# Altium schematic symbol library NXP_60_26022015.SCHLIB: 1306 symbols (part 26 of 28)
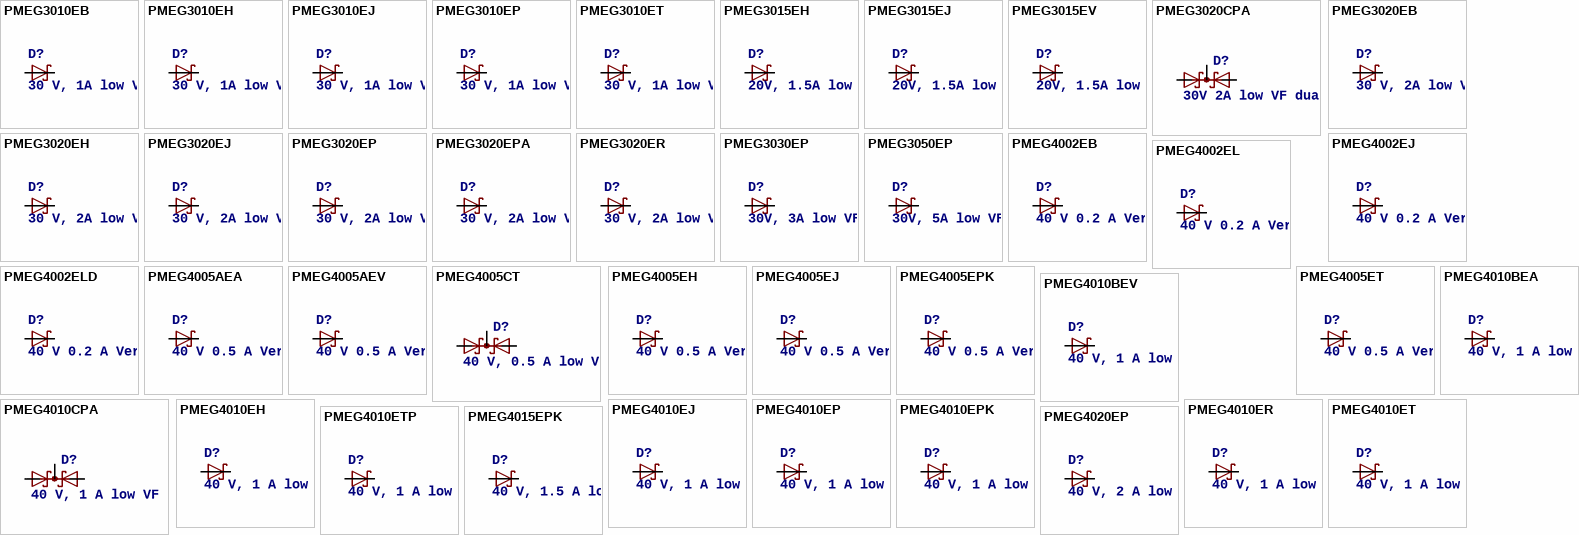
[diagram p210: symbols PMEG3010EB to PMEG4020EP]

## PMEG4010EPK
designator D?, comment 40 V, 1 A low VF MEGA Schottky barrier rectifier  Planar Maximum Efficiency General Application (MEGA) Schottky barrier rectifier with an integrated guard ring for stress protection.     AAL Eindhoven MK
footprint SOD1608
pins: 1 K, 2 A

## PMEG4010ER
designator D?, comment 40 V, 1 A low VF MEGA Schottky barrier rectifier  Planar Maximum Efficiency General Application (MEGA) Schottky barrier rectifier with an integrated guard ring for stress protection.     AAL Eindhoven MK
footprint SOD123W
pins: 1 K, 2 A

## PMEG4010ET
designator D?, comment 40 V, 1 A low VF MEGA Schottky barrier rectifier  Planar Maximum Efficiency General Application (MEGA) Schottky barrier rectifier with an integrated guard ring for stress protection.     AAL Eindhoven MK
footprint SOT23
pins: 1 A, 3 K

## PMEG4010ETP
designator D?, comment 40 V, 1 A low VF MEGA Schottky barrier rectifier  Planar Maximum Efficiency General Application (MEGA) Schottky barrier rectifier with an integrated guard ring for stress protection.     AAL Eindhoven MK
footprint SOD128
pins: 1 K, 2 A

## PMEG4015EPK
designator D?, comment 40 V, 1.5 A low VF MEGA Schottky barrier rectifier  Planar Maximum Efficiency General Application (MEGA) Schottky barrier rectifier with an integrated guard ring for stress protection, encapsulated in a leadless ultra small SOD1608 (DFN1608D-2) Surface-Mounted Device (SMD) plastic package with visible and solderable side pads     AAL Eindhoven MK
footprint SOD1608
pins: 1 K, 2 A

## PMEG4020EP
designator D?, comment 40 V, 2 A low VF MEGA Schottky barrier rectifier  Planar Maximum Efficiency General Application (MEGA) Schottky barrier rectifier with an integrated guard ring for stress protection.     AAL Eindhoven MK
footprint SOD128
pins: 1 K, 2 A

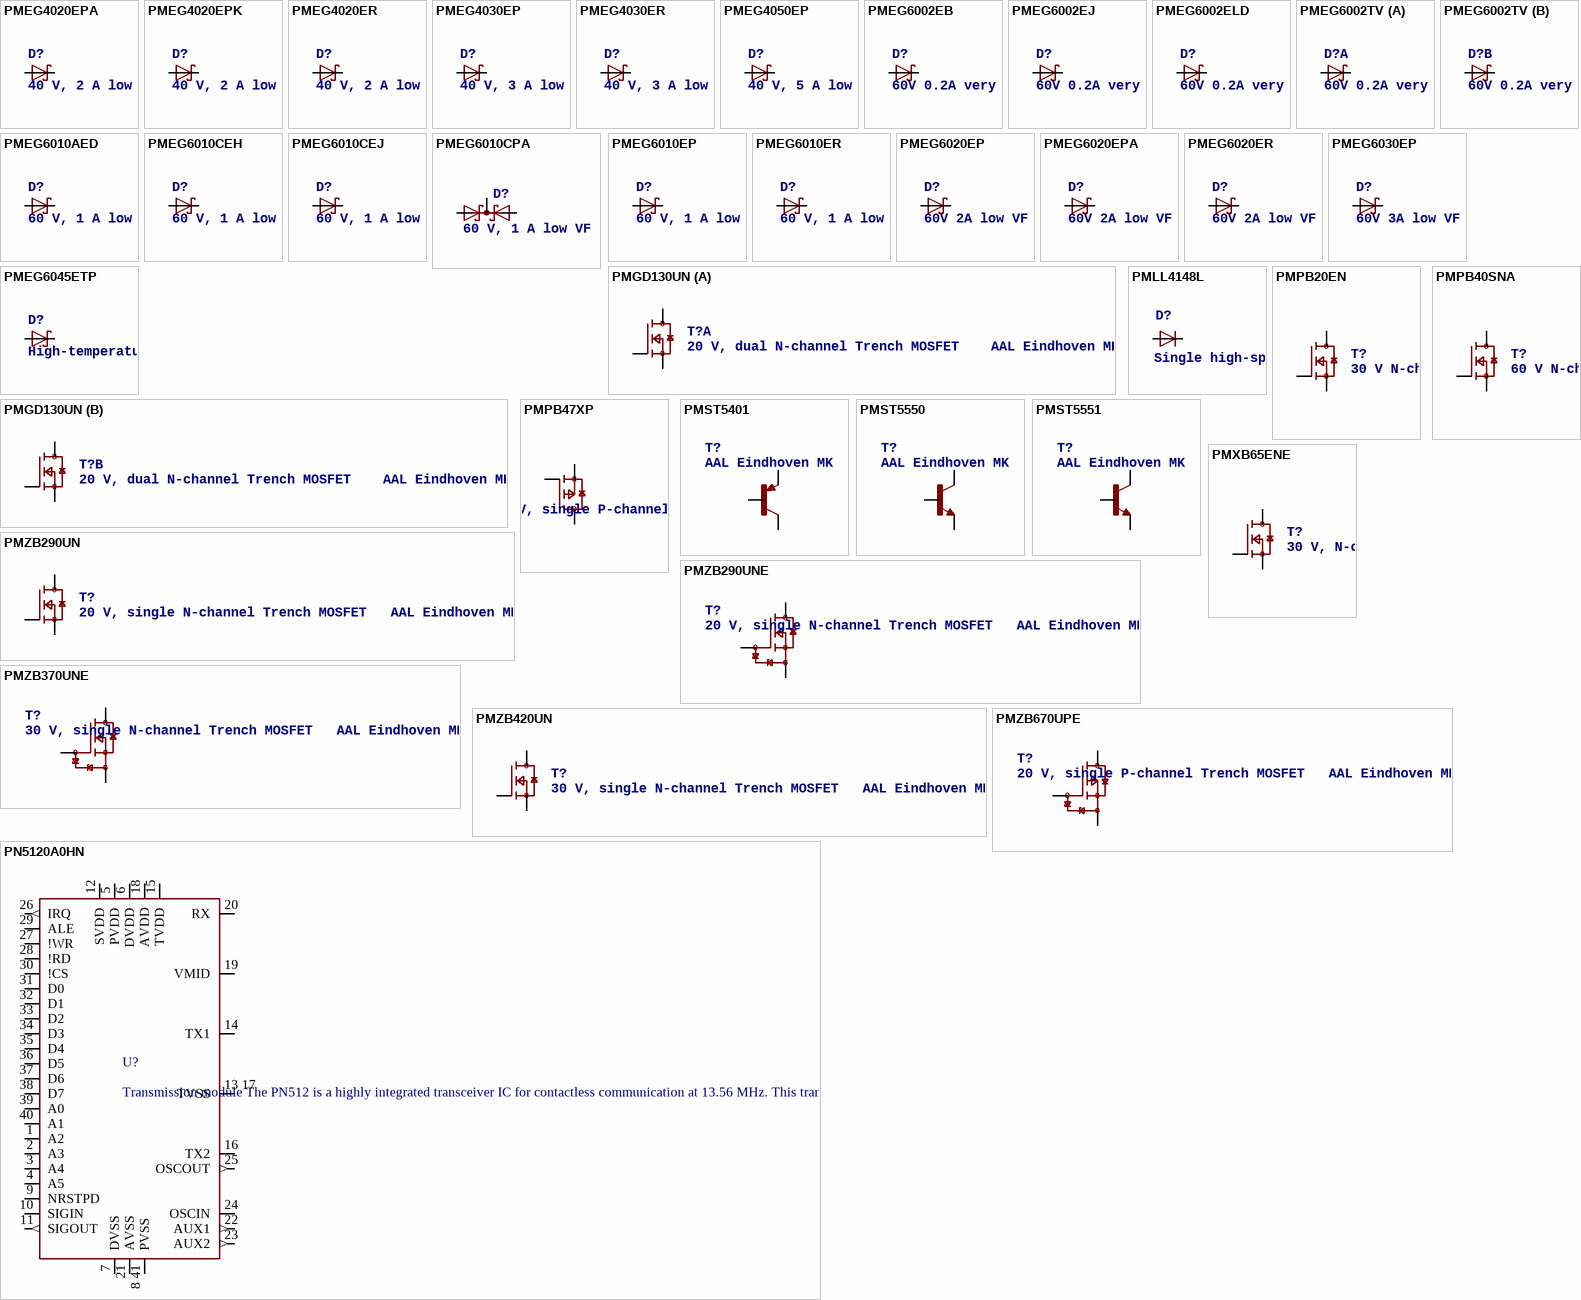
[diagram p171: symbols PMEG4020EPA to PN5120A0HN]

## PMEG4020EPA
designator D?, comment 40 V, 2 A low VF MEGA Schottky barrier rectifier  Planar Maximum Efficiency General Application (MEGA) Schottky barrier rectifier with an integrated guard ring for stress protection.     AAL Eindhoven MK
footprint SOT1061
pins: 1 2 A, 3 K

## PMEG4020EPK
designator D?, comment 40 V, 2 A low VF MEGA Schottky barrier rectifier  Planar Maximum Efficiency General Application (MEGA) Schottky barrier rectifier with an integrated guard ring for stress protection.     AAL Eindhoven MK
footprint SOD1608
pins: 1 K, 2 A

## PMEG4020ER
designator D?, comment 40 V, 2 A low VF MEGA Schottky barrier rectifier  Planar Maximum Efficiency General Application (MEGA) Schottky barrier rectifier with an integrated guard ring for stress protection.     AAL Eindhoven MK
footprint SOD123W
pins: 1 K, 2 A

## PMEG4030EP
designator D?, comment 40 V, 3 A low VF MEGA Schottky barrier rectifier  Planar Maximum Efficiency General Application (MEGA) Schottky barrier rectifier with an integrated guard ring for stress protection.     AAL Eindhoven MK
footprint SOD128
pins: 1 K, 2 A

## PMEG4030ER
designator D?, comment 40 V, 3 A low VF MEGA Schottky barrier rectifier  Planar Maximum Efficiency General Application (MEGA) Schottky barrier rectifier with an integrated guard ring for stress protection.     AAL Eindhoven MK
footprint SOD123W
pins: 1 K, 2 A

## PMEG4050EP
designator D?, comment 40 V, 5 A low VF MEGA Schottky barrier rectifier  Planar Maximum Efficiency General Application (MEGA) Schottky barrier rectifier with an integrated guard ring for stress protection.     AAL Eindhoven MK
footprint SOD128
pins: 1 K, 2 A

## PMEG6002EB
designator D?, comment 60V 0.2A very low VF MEGA Schottky barrier recti?ers Planar Maximum Ef?ciency General Application (MEGA) Schottky barrier recti?ers with an integrated guard ring for stress protection, encapsulated in ultra small and ?at lead Surface-Mounted Device (SMD) plastic packages.   AAL Eindhoven MK
footprint SOD523
pins: 1 K, 2 A

## PMEG6002EJ
designator D?, comment 60V 0.2A very low VF MEGA Schottky barrier recti?ers Planar Maximum Ef?ciency General Application (MEGA) Schottky barrier recti?ers with an integrated guard ring for stress protection, encapsulated in ultra small and ?at lead Surface-Mounted Device (SMD) plastic packages.   AAL Eindhoven MK
footprint SOD323(F)
pins: 1 K, 2 A

## PMEG6002ELD
designator D?, comment 60V 0.2A very low VF MEGA Schottky barrier recti?ers Planar Maximum Ef?ciency General Application (MEGA) Schottky barrier recti?ers with an integrated guard ring for stress protection, encapsulated in ultra small and ?at lead Surface-Mounted Device (SMD) plastic packages.   AAL Eindhoven MK
footprint SOD882D
pins: 1 K, 2 A

## PMEG6002TV
designator D?, comment 60V 0.2A very low VF MEGA Schottky barrier recti?ers Planar Maximum Ef?ciency General Application (MEGA) Schottky barrier recti?ers with an integrated guard ring for stress protection, encapsulated in ultra small and ?at lead Surface-Mounted Device (SMD) plastic packages.   AAL Eindhoven MK
footprint SOT666
part A pins: 1 A, 6 K
part B pins: 3 K, 4 A

## PMEG6010AED
designator D?, comment 60 V, 1 A low VF MEGA Schottky barrier rectifier  Planar Maximum Efficiency General Application (MEGA) Schottky barrier rectifier with an integrated guard ring for stress protection, encapsulated in a leadless ultra small SOD1608 (DFN1608D-2) Surface-Mounted Device (SMD) plastic package with visible and solderable side pads     AAL Eindhoven MK
footprint SOT457
pins: 1 2 5 6 K, 3 4 A

## PMEG6010CEH
designator D?, comment 60 V, 1 A low VF MEGA Schottky barrier rectifier  Planar Maximum Efficiency General Application (MEGA) Schottky barrier rectifier with an integrated guard ring for stress protection, encapsulated in a leadless ultra small SOD1608 (DFN1608D-2) Surface-Mounted Device (SMD) plastic package with visible and solderable side pads     AAL Eindhoven MK
footprint SOD123F
pins: 1 K, 2 A

## PMEG6010CEJ
designator D?, comment 60 V, 1 A low VF MEGA Schottky barrier rectifier  Planar Maximum Efficiency General Application (MEGA) Schottky barrier rectifier with an integrated guard ring for stress protection, encapsulated in a leadless ultra small SOD1608 (DFN1608D-2) Surface-Mounted Device (SMD) plastic package with visible and solderable side pads     AAL Eindhoven MK
footprint SOD323(F)
pins: 1 K, 2 A

## PMEG6010CPA
designator D?, comment 60 V, 1 A low VF MEGA Schottky barrier rectifier  Planar Maximum Efficiency General Application (MEGA) Schottky barrier rectifier with an integrated guard ring for stress protection, encapsulated in a leadless ultra small SOD1608 (DFN1608D-2) Surface-Mounted Device (SMD) plastic package with visible and solderable side pads     AAL Eindhoven MK
footprint SOT1061
pins: 1 A1, 2 A2, 3 K1K2

## PMEG6010EP
designator D?, comment 60 V, 1 A low VF MEGA Schottky barrier rectifier  Planar Maximum Efficiency General Application (MEGA) Schottky barrier rectifier with an integrated guard ring for stress protection, encapsulated in a leadless ultra small SOD1608 (DFN1608D-2) Surface-Mounted Device (SMD) plastic package with visible and solderable side pads     AAL Eindhoven MK
footprint SOD128
pins: 1 K, 2 A

## PMEG6010ER
designator D?, comment 60 V, 1 A low VF MEGA Schottky barrier rectifier  Planar Maximum Efficiency General Application (MEGA) Schottky barrier rectifier with an integrated guard ring for stress protection, encapsulated in a leadless ultra small SOD1608 (DFN1608D-2) Surface-Mounted Device (SMD) plastic package with visible and solderable side pads     AAL Eindhoven MK
footprint SOD123W
pins: 1 K, 2 A

## PMEG6020EP
designator D?, comment 60V 2A low VF dual MEGA Schottky barrier rectifier  Planar Maximum Efficiency General Application (MEGA) Schottky barrier rectifier in common cathode configuration with an integrated guard ring for stress protection, encapsulated in a SOT1061 leadless small Surface-Mounted Device (SMD) plastic package with medium power capability.    AAL Eindhoven MK
footprint SOD128
pins: 1 K, 2 A

## PMEG6020EPA
designator D?, comment 60V 2A low VF dual MEGA Schottky barrier rectifier  Planar Maximum Efficiency General Application (MEGA) Schottky barrier rectifier in common cathode configuration with an integrated guard ring for stress protection, encapsulated in a SOT1061 leadless small Surface-Mounted Device (SMD) plastic package with medium power capability.    AAL Eindhoven MK
footprint SOT1061
pins: 1 2 A, 3 K

## PMEG6020ER
designator D?, comment 60V 2A low VF dual MEGA Schottky barrier rectifier  Planar Maximum Efficiency General Application (MEGA) Schottky barrier rectifier in common cathode configuration with an integrated guard ring for stress protection, encapsulated in a SOT1061 leadless small Surface-Mounted Device (SMD) plastic package with medium power capability.    AAL Eindhoven MK
footprint SOD123W
pins: 1 K, 2 A

## PMEG6030EP
designator D?, comment 60V 3A low VF dual MEGA Schottky barrier rectifier  Planar Maximum Efficiency General Application (MEGA) Schottky barrier rectifier in common cathode configuration with an integrated guard ring for stress protection, encapsulated in a SOT1061 leadless small Surface-Mounted Device (SMD) plastic package with medium power capability.    AAL Eindhoven MK
footprint SOD128
pins: 1 K, 2 A

## PMEG6045ETP
designator D?, comment High-temperature 60 V, 4.5 A Schottky barrier rectifier Planar Maximum Efficiency General Application (MEGA) Schottky barrier rectifier with an integrated guard ring for stress protection, encapsulated in a SOD128 small and flat lead Surface-Mounted Device (SMD) plastic package.    AAL Eindhoven MK
footprint SOD128
pins: 1 K, 2 A

## PMGD130UN
designator T?, comment 20 V, dual N-channel Trench MOSFET    AAL Eindhoven MK
footprint SOT363
part A pins: 1 S, 2 G, 6 D
part B pins: 3 D, 4 S, 5 G

## PMLL4148L
designator D?, comment Single high-speed switching diodes, fabricated in planar technology, and encapsulated in small hermetically sealed glass SOD80C Surface-Mounted Device (SMD) packages.    AAL Eindhoven MK
FARNELL: 1097176
footprint SOD80C
pins: 1 K, 2 A

## PMPB20EN
designator T?, comment 30 V N-channel Trench MOSFET N-channel enhancement mode Field-Effect Transistor (FET) in a leadless medium power DFN2020MD-6 (SOT1220) Surface-Mounted Device (SMD) plastic package using Trench MOSFET technology.    AAL Eindhoven MK
footprint SOT1220
pins: 1 2 5 6 7 D, 3 G, 4 8 S

## PMPB40SNA
designator T?, comment 60 V N-channel Trench MOSFET N-channel enhancement mode Field-Effect Transistor (FET) in a leadless medium power DFN2020MD-6 (SOT1220) Surface-Mounted Device (SMD) plastic package using Trench MOSFET technology.    AAL Eindhoven MK
footprint SOT1220
pins: 1 2 5 6 7 D, 3 G, 4 8 S

## PMPB47XP
designator T?, comment 30 V, single P-channel Trench MOSFET P-channel enhancement mode Field-Effect Transistor (FET) in a leadless medium power DFN2020MD-6 (SOT1220) Surface-Mounted Device (SMD) plastic package using Trench MOSFET technology.    AAL Eindhoven MK
footprint SOT1220
pins: 1 2 5 6 7 D, 3 G, 4 8 S

## PMST5401
designator T?, comment AAL Eindhoven MK
footprint SOT323
pins: 1 B, 2 E, 3 C

## PMST5550
designator T?, comment AAL Eindhoven MK
footprint SOT323
pins: 1 B, 2 E, 3 C

## PMST5551
designator T?, comment AAL Eindhoven MK
footprint SOT323
pins: 1 B, 2 E, 3 C

## PMXB65ENE
designator T?, comment 30 V, N-channel Trench MOSFET N-channel enhancement mode Field-Effect Transistor (FET) in a leadless ultra small DFN1010D-3 (SOT1215) Surface-Mounted Device (SMD) plastic package using Trench MOSFET technology.    AAL Eindhoven MK
footprint SOT1215
pins: 1 G, 2 S, 3 D

## PMZB290UN
designator T?, comment 20 V, single N-channel Trench MOSFET   AAL Eindhoven MK
footprint SOT883(B)
pins: 1 G, 2 S, 3 D

## PMZB290UNE
designator T?, comment 20 V, single N-channel Trench MOSFET   AAL Eindhoven MK
footprint SOT883(B)
pins: 1 G, 2 S, 3 D

## PMZB370UNE
designator T?, comment 30 V, single N-channel Trench MOSFET   AAL Eindhoven MK
footprint SOT883(B)
pins: 1 G, 2 S, 3 D

## PMZB420UN
designator T?, comment 30 V, single N-channel Trench MOSFET   AAL Eindhoven MK
footprint SOT883(B)
pins: 1 G, 2 S, 3 D

## PMZB670UPE
designator T?, comment 20 V, single P-channel Trench MOSFET   AAL Eindhoven MK
footprint SOT883(B)
pins: 1 G, 2 S, 3 D

## PN5120A0HN
designator U?, comment Transmission module The PN512 is a highly integrated transceiver IC for contactless communication at 13.56 MHz. This transceiver IC utilizes an outstanding modulation and demodulation concept completely integrated for different kinds of contactless communication methods and protocols at 13.56 MHz.     AAL Eindhoven MK
footprint SOT618-1
pins: 1 A2, 2 A3, 3 A4, 4 A5, 5 PVDD (power), 6 DVDD (power), 7 DVSS (power), 8 41 PVSS (power), 9 NRSTPD, 10 SIGIN, 11 SIGOUT (out), 12 SVDD (power), 13 17 TVSS, 14 TX1, 15 TVDD (power), 16 TX2, 18 AVDD (power), 19 VMID, 20 RX, 21 AVSS (power), 22 AUX1 (out), 23 AUX2 (out), 24 OSCIN, 25 OSCOUT (out), 26 IRQ (out), 27 !WR, 28 !RD, 29 ALE, 30 !CS, 31 D0, 32 D1, 33 D2, 34 D3, 35 D4, 36 D5, 37 D6, 38 D7, 39 A0, 40 A1

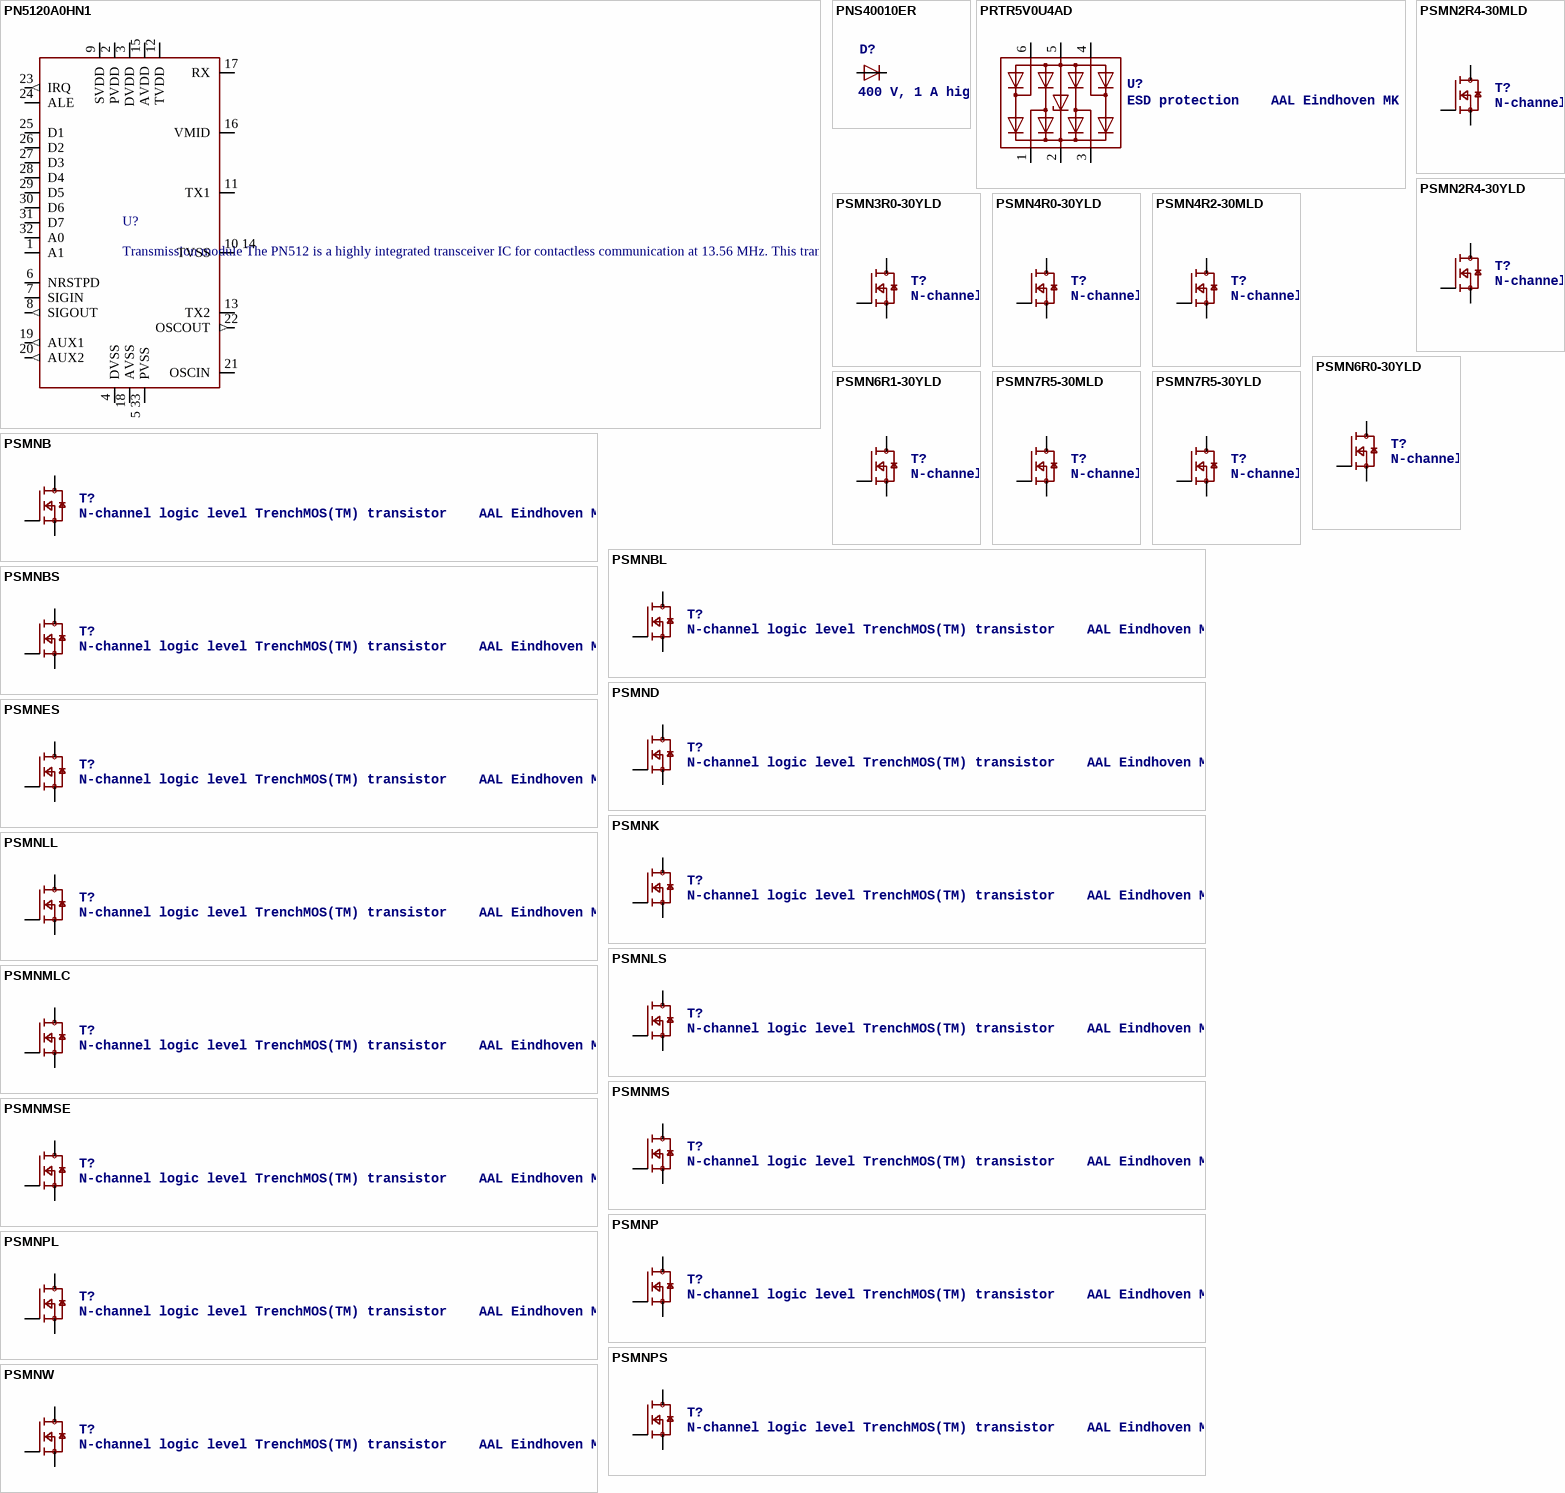
[diagram p172: symbols PN5120A0HN1 to PSMNW]

## PN5120A0HN1
designator U?, comment Transmission module The PN512 is a highly integrated transceiver IC for contactless communication at 13.56 MHz. This transceiver IC utilizes an outstanding modulation and demodulation concept completely integrated for different kinds of contactless communication methods and protocols at 13.56 MHz.     AAL Eindhoven MK
footprint SOT617-1
pins: 1 A1, 2 PVDD (power), 3 DVDD (power), 4 DVSS (power), 5 33 PVSS (power), 6 NRSTPD, 7 SIGIN, 8 SIGOUT (out), 9 SVDD (power), 10 14 TVSS, 11 TX1, 12 TVDD (power), 13 TX2, 15 AVDD (power), 16 VMID, 17 RX, 18 AVSS (power), 19 AUX1 (out), 20 AUX2 (out), 21 OSCIN, 22 OSCOUT (out), 23 IRQ (out), 24 ALE, 25 D1, 26 D2, 27 D3, 28 D4, 29 D5, 30 D6, 31 D7, 32 A0

## PNS40010ER
designator D?, comment 400 V, 1 A high power density, standard switching time PN-rectifier High power density, standard switching time PN-rectifier with high-efficiency planar technology, encapsulated in a small and flat lead SOD123W Surface-Mounted Device (SMD) plastic package.    AAL Eindhoven MK
footprint SOD123W
pins: 1 K, 2 A

## PRTR5V0U4AD
designator U?, comment ESD protection    AAL Eindhoven MK
FARNELL: 1757868
footprint SOT457
pins: 1 ESD1, 2 VCC (power), 3 ESD2, 4 ESD3, 5 GND (power), 6 ESD4

## PSMN2R4-30MLD
designator T?, comment N-channel 30 V, 2.4 mΩ logic level MOSFET in LFPAK33 using NextPowerS3 Technology Logic level gate drive N-channel enhancement mode MOSFET in LFPAK33 and LFPAK56 package. NextPowerS3 portfolio utilising NXP’s unique “SchottkyPlus” technology delivers high efficiency, low spiking performance usually associated with MOSFETs with an integrated Schottky or Schottky-like diode but without problematic high leakage current. NextPowerS3 is particularly suited to high efficiency applications at high switching frequencies.    AAL Eindhoven MK
footprint SOT1210
pins: 1 2 3 S, 4 G, MB@1 MB@2 MB@3 MB@4 D

## PSMN2R4-30YLD
designator T?, comment N-channel 30 V, 2.4 mΩ logic level MOSFET in LFPAK33 using NextPowerS3 Technology Logic level gate drive N-channel enhancement mode MOSFET in LFPAK33 and LFPAK56 package. NextPowerS3 portfolio utilising NXP’s unique “SchottkyPlus” technology delivers high efficiency, low spiking performance usually associated with MOSFETs with an integrated Schottky or Schottky-like diode but without problematic high leakage current. NextPowerS3 is particularly suited to high efficiency applications at high switching frequencies.    AAL Eindhoven MK
footprint SOT669
pins: 1 2 3 S, 4 G, MB D

## PSMN3R0-30YLD
designator T?, comment N-channel 30 V, 3.0 mΩ logic level MOSFET in LFPAK56 using NextPowerS3 Technology Logic level gate drive N-channel enhancement mode MOSFET in LFPAK56 package. NextPowerS3 portfolio utilising NXP’s unique “SchottkyPlus” technology delivers high efficiency, low spiking performance usually associated with MOSFETs with an integrated Schottky or Schottky-like diode but without problematic high leakage current. NextPowerS3 is particularly suited to high efficiency applications at high switching frequencies.    AAL Eindhoven MK
footprint SOT669
pins: 1 2 3 S, 4 G, MB D

## PSMN4R0-30YLD
designator T?, comment N-channel 30 V, 4.0 mΩ logic level MOSFET in LFPAK56 using NextPowerS3 Technology Logic level gate drive N-channel enhancement mode MOSFET in LFPAK56 package. NextPowerS3 portfolio utilising NXP’s unique “SchottkyPlus” technology delivers high efficiency, low spiking performance usually associated with MOSFETs with an integrated Schottky or Schottky-like diode but without problematic high leakage current. NextPowerS3 is particularly suited to high efficiency applications at high switching frequencies.    AAL Eindhoven MK
footprint SOT669
pins: 1 2 3 S, 4 G, MB D

## PSMN4R2-30MLD
designator T?, comment N-channel 30 V, 4.2 mΩ logic level MOSFET in LFPAK33 using NextPowerS3 Technology Logic level gate drive N-channel enhancement mode MOSFET in LFPAK33 package. NextPowerS3 portfolio utilising NXP’s unique “SchottkyPlus” technology delivers high efficiency, low spiking performance usually associated with MOSFETs with an integrated Schottky or Schottky-like diode but without problematic high leakage current. NextPowerS3 is particularly suited to high efficiency applications at high switching frequencies.    AAL Eindhoven MK
footprint SOT1210
pins: 1 2 3 S, 4 G, MB@1 MB@2 MB@3 MB@4 D

## PSMN6R0-30YLD
designator T?, comment N-channel 30 V, 6.0 mΩ logic level MOSFET in LFPAK56 using NextPowerS3 Technology Logic level gate drive N-channel enhancement mode MOSFET in LFPAK56 package. NextPowerS3 portfolio utilising NXP’s unique “SchottkyPlus” technology delivers high efficiency, low spiking performance usually associated with MOSFETs with an integrated Schottky or Schottky-like diode but without problematic high leakage current. NextPowerS3 is particularly suited to high efficiency applications at high switching frequencies.    AAL Eindhoven MK
footprint SOT669
pins: 1 2 3 S, 4 G, MB D

## PSMN6R1-30YLD
designator T?, comment N-channel 30 V, 6.1 mΩ logic level MOSFET in LFPAK56 using NextPowerS3 Technology Logic level gate drive N-channel enhancement mode MOSFET in LFPAK56 package. NextPowerS3 portfolio utilising NXP’s unique “SchottkyPlus” technology delivers high efficiency, low spiking performance usually associated with MOSFETs with an integrated Schottky or Schottky-like diode but without problematic high leakage current. NextPowerS3 is particularly suited to high efficiency applications at high switching frequencies.    AAL Eindhoven MK
footprint SOT669
pins: 1 2 3 S, 4 G, MB D

## PSMN7R5-30MLD
designator T?, comment N-channel 30 V, 7.5 mΩ logic level MOSFET in LFPAK33 using NextPowerS3 Technology Logic level gate drive N-channel enhancement mode MOSFET in LFPAK33 and LFPAK56 package. NextPowerS3 portfolio utilising NXP’s unique “SchottkyPlus” technology delivers high efficiency, low spiking performance usually associated with MOSFETs with an integrated Schottky or Schottky-like diode but without problematic high leakage current. NextPowerS3 is particularly suited to high efficiency applications at high switching frequencies.    AAL Eindhoven MK
footprint SOT1210
pins: 1 2 3 S, 4 G, MB@1 MB@2 MB@3 MB@4 D

## PSMN7R5-30YLD
designator T?, comment N-channel 30 V, 7.5 mΩ logic level MOSFET in LFPAK33 using NextPowerS3 Technology Logic level gate drive N-channel enhancement mode MOSFET in LFPAK33 and LFPAK56 package. NextPowerS3 portfolio utilising NXP’s unique “SchottkyPlus” technology delivers high efficiency, low spiking performance usually associated with MOSFETs with an integrated Schottky or Schottky-like diode but without problematic high leakage current. NextPowerS3 is particularly suited to high efficiency applications at high switching frequencies.    AAL Eindhoven MK
footprint SOT669
pins: 1 2 3 S, 4 G, MB D

## PSMNB
designator T?, comment N-channel logic level TrenchMOS(TM) transistor    AAL Eindhoven MK
footprint SOT404
pins: 1 G, 3 S, MB D

## PSMNBL
designator T?, comment N-channel logic level TrenchMOS(TM) transistor    AAL Eindhoven MK
footprint SOT404
pins: 1 G, 3 S, MB D

## PSMNBS
designator T?, comment N-channel logic level TrenchMOS(TM) transistor    AAL Eindhoven MK
footprint SOT404
pins: 1 G, 3 S, MB D

## PSMND
designator T?, comment N-channel logic level TrenchMOS(TM) transistor    AAL Eindhoven MK
footprint SOT428
pins: 1 G, 3 S, MB D

## PSMNES
designator T?, comment N-channel logic level TrenchMOS(TM) transistor    AAL Eindhoven MK
footprint SOT226
pins: 1 G, 2 D, 3 S

## PSMNK
designator T?, comment N-channel logic level TrenchMOS(TM) transistor    AAL Eindhoven MK
footprint SOT96-1
pins: 1 2 3 S, 4 G, 5 6 7 8 D

## PSMNLL
designator T?, comment N-channel logic level TrenchMOS(TM) transistor    AAL Eindhoven MK
footprint SOT873-1
pins: 1 2 3 S, 4 G, 5 6 7 8 D

## PSMNLS
designator T?, comment N-channel logic level TrenchMOS(TM) transistor    AAL Eindhoven MK
footprint SOT873-1
pins: 1 2 3 S, 4 G, 5 6 7 8 D

## PSMNMLC
designator T?, comment N-channel logic level TrenchMOS(TM) transistor    AAL Eindhoven MK
LOGIC_LEVEL: 13 mOhm; VOLTAGE: 30V; LOGIC_LEVEL: 2.8 mOhm; VOLTAGE: 25V; LOGIC_LEVEL: 2.9 mOhm; LOGIC_LEVEL: 3.0 mOhm; LOGIC_LEVEL: 3.9 mOhm; LOGIC_LEVEL: 4.4 mOhm; LOGIC_LEVEL: 7.0 mOhm; LOGIC_LEVEL: 9.0 mOhm; LOGIC_LEVEL: 9.8 mOhm
footprint SOT1210
pins: 1 2 3 S, 4 G, MB@1 MB@2 MB@3 MB@4 D

## PSMNMS
designator T?, comment N-channel logic level TrenchMOS(TM) transistor    AAL Eindhoven MK
footprint SOT1210
pins: 1 2 3 S, 4 G, MB@1 MB@2 MB@3 MB@4 D

## PSMNMSE
designator T?, comment N-channel logic level TrenchMOS(TM) transistor    AAL Eindhoven MK
footprint SOT1210
pins: 1 2 3 S, 4 G, MB@1 MB@2 MB@3 MB@4 D

## PSMNP
designator T?, comment N-channel logic level TrenchMOS(TM) transistor    AAL Eindhoven MK
footprint SOT78
pins: 1 G, 2 D, 3 S

## PSMNPL
designator T?, comment N-channel logic level TrenchMOS(TM) transistor    AAL Eindhoven MK
footprint SOT78
pins: 1 G, 2 D, 3 S

## PSMNPS
designator T?, comment N-channel logic level TrenchMOS(TM) transistor    AAL Eindhoven MK
footprint SOT78
pins: 1 G, 2 D, 3 S

## PSMNW
designator T?, comment N-channel logic level TrenchMOS(TM) transistor    AAL Eindhoven MK
footprint SOT429
pins: 1 G, 2 D, 3 S

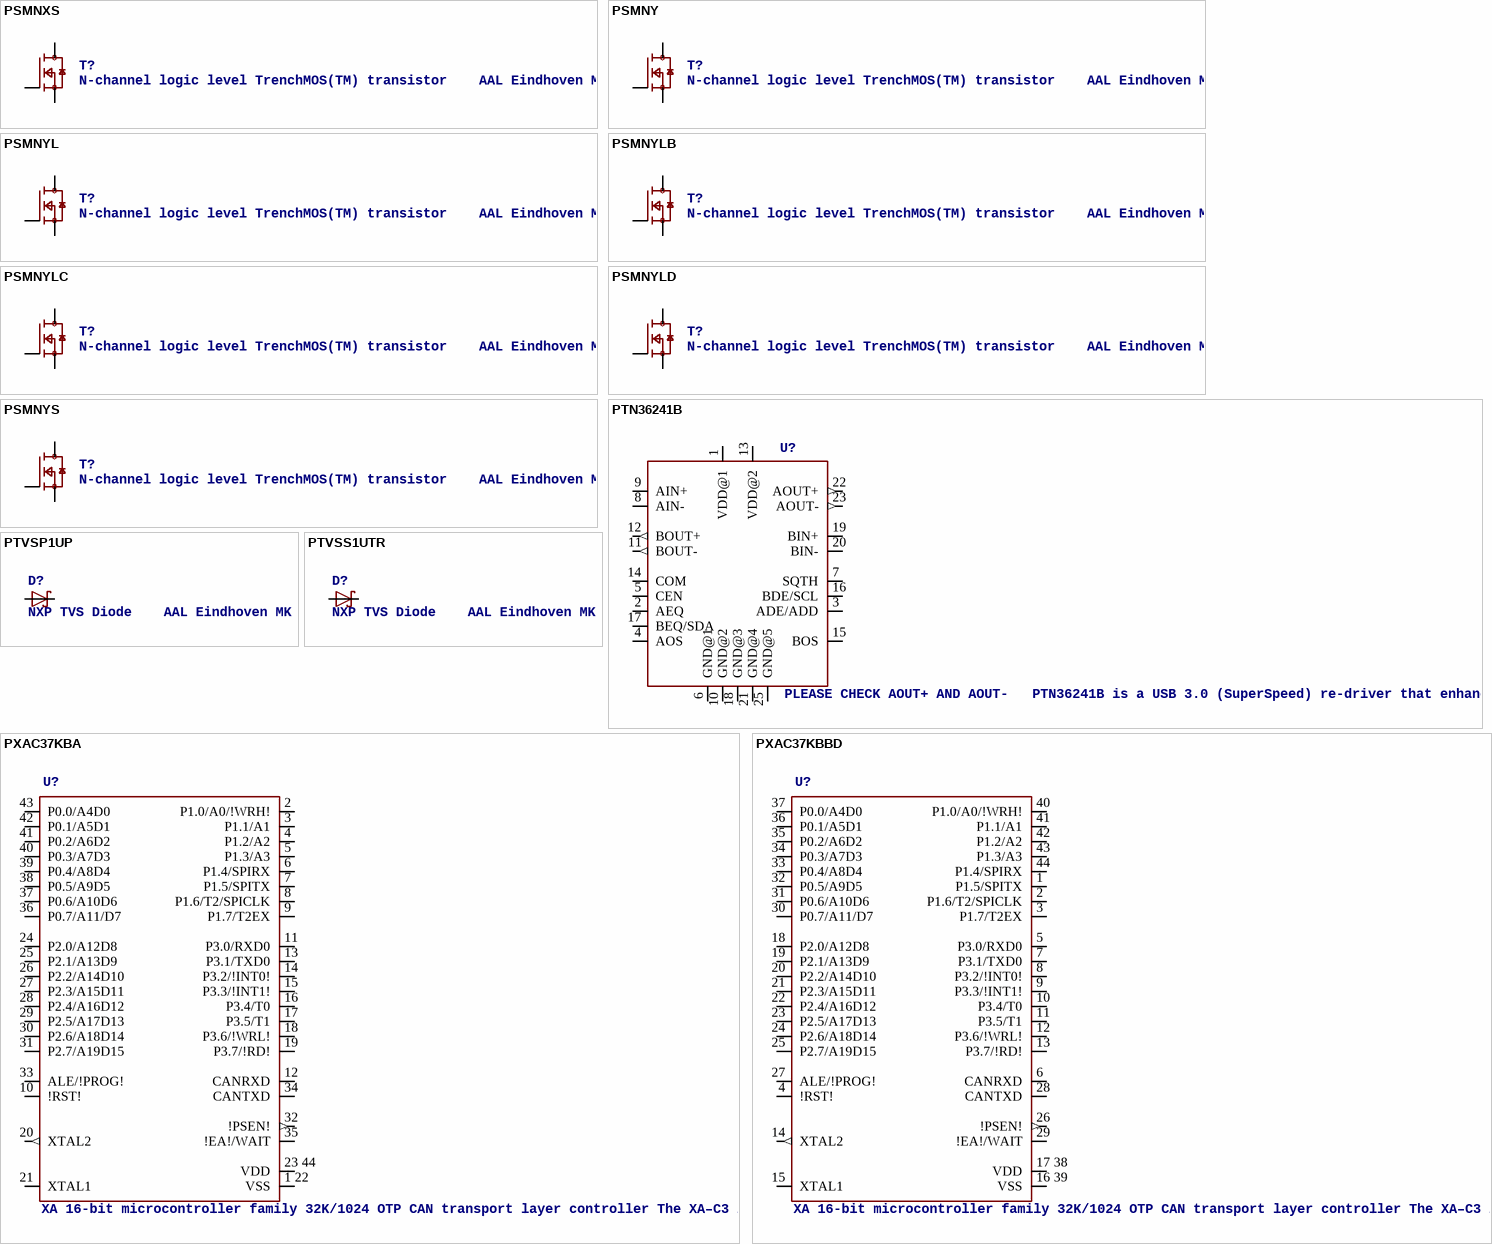
[diagram p173: symbols PSMNXS to PXAC37KBBD]

## PSMNXS
designator T?, comment N-channel logic level TrenchMOS(TM) transistor    AAL Eindhoven MK
footprint SOT186A
pins: 1 G, 2 D, 3 S

## PSMNY
designator T?, comment N-channel logic level TrenchMOS(TM) transistor    AAL Eindhoven MK
footprint SOT669
pins: 1 2 3 S, 4 G, MB D

## PSMNYL
designator T?, comment N-channel logic level TrenchMOS(TM) transistor    AAL Eindhoven MK
footprint SOT1023
pins: 1 2 3 S, 4 G, MB D

## PSMNYLB
designator T?, comment N-channel logic level TrenchMOS(TM) transistor    AAL Eindhoven MK
footprint SOT669
pins: 1 2 3 S, 4 G, MB D

## PSMNYLC
designator T?, comment N-channel logic level TrenchMOS(TM) transistor    AAL Eindhoven MK
footprint SOT669
pins: 1 2 3 S, 4 G, MB D

## PSMNYLD
designator T?, comment N-channel logic level TrenchMOS(TM) transistor    AAL Eindhoven MK
footprint SOT669
pins: 1 2 3 S, 4 G, MB D
